# Altium footprint library main.PcbLib: 217 footprints (part 11 of 14)
Each footprint in its own frame and in the unit in brackets; x right, y up, seen from the top. Pads: shape width x height; smd on the part's side, far side on the other; paste and mask are expansions set on the pad; w line width, h text height; cw(c..) or ccw(c..) is an arc to the next point about the centre after c.
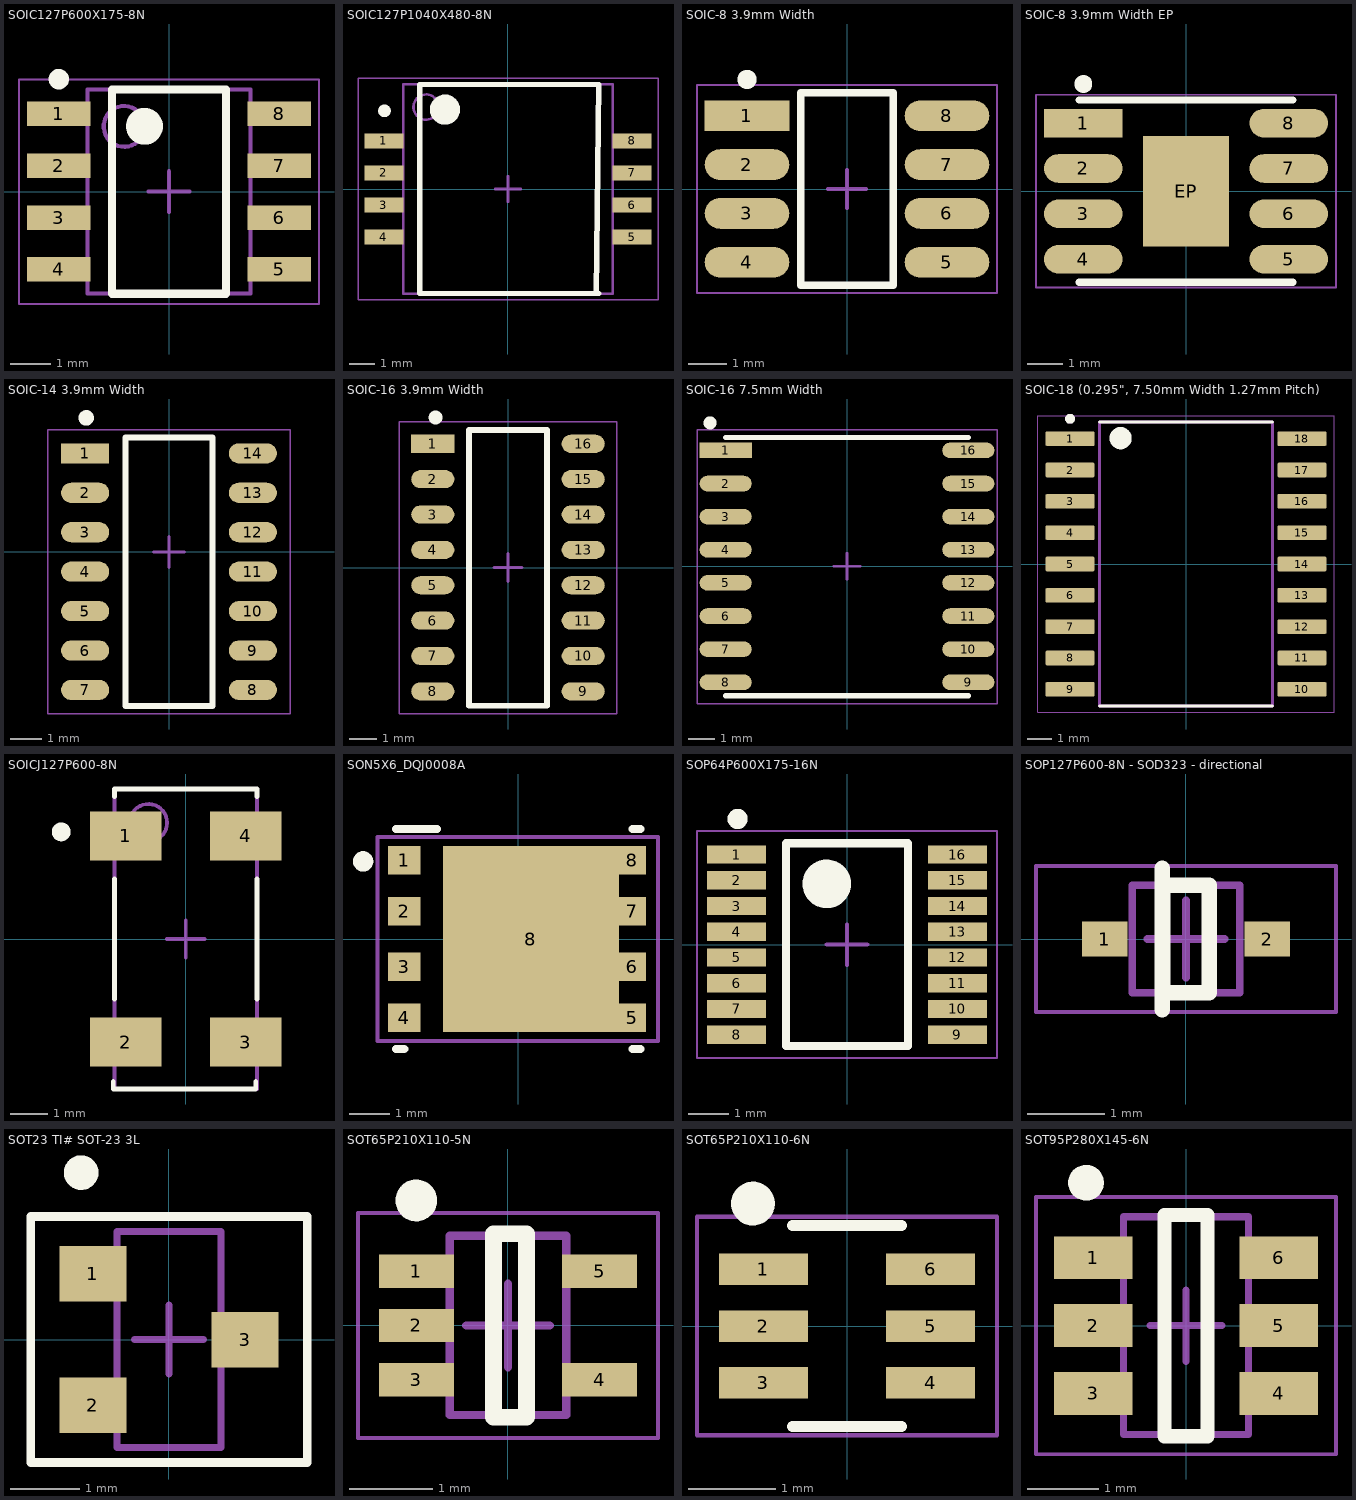
[diagram p10: the footprints below, top view; thin cyan lines are the x and y axes]

## SOIC127P600X175-8N [mm] "SOIC, 8-Leads, Body 4.90x3.90mm, Pitch 1.27mm, IPC Medium Density"
height 1.75
pads (8):
  rect 1.55x0.6 smd: 1(-2.7,1.905) 2(-2.7,0.635) 3(-2.7,-0.635) 4(-2.7,-1.905) 5(2.7,-1.905) 6(2.7,-0.635) 7(2.7,0.635) 8(2.7,1.905)
Top Overlay:
  circle w0.6: c-0.6,1.6 r0.15
  circle w0.25: c-2.7,2.755 r0.125
  lines w0.2: -1.4,-2.5 1.4,-2.5 1.4,2.5 -1.4,2.5 -1.4,-2.5
Mechanical 7:
  text ".Designator" at -2.921,-0.762 h1.52
Mechanical 13:
  circle w0.1: c-1.1,1.6 r0.5
  lines w0.1: -2,-2.5 2,-2.5 2,2.5 -2,2.5 -2,-2.5
Mechanical 15:
  lines w0.05: -3.675,-2.75 3.675,-2.75 3.675,2.75 -3.675,2.75 -3.675,-2.75
  lines w0.1: -0.5,0 0.5,0 ; 0,-0.5 0,0.5
3D body: height 1.75, standoff 0.2, extent -2,-2.5 2,2.5

## SOIC127P1040X480-8N [mm] "SOIC, 8-Leads, Body 8.26x8.26mm, Pitch 1.27mm, IPC Medium Density"
height 4.8
pads (8):
  rect 1.55x0.6 smd: 1(-4.925,1.905) 2(-4.925,0.635) 3(-4.925,-0.635) 4(-4.925,-1.905) 5(4.925,-1.905) 6(4.925,-0.635) 7(4.925,0.635) 8(4.925,1.905)
Top Overlay:
  circle w0.25: c-4.9,3.1 r0.125
  circle w0.6: c-2.5,3.15 r0.3
  lines w0.2: 3.5,-4.15 3.6,4.15 -3.5,4.15 -3.5,-4.15 3.6,-4.15
Mechanical 7:
  text ".Designator" at -3.615,-0.902 h1.52
Mechanical 13:
  circle w0.1: c-3.25,3.25 r0.5
  lines w0.1: -4.15,-4.15 -4.15,4.15 4.15,4.15 4.15,-4.15 -4.15,-4.15
Mechanical 15:
  lines w0.05: -5.95,-4.4 -5.95,4.4 5.95,4.4 5.95,-4.4 -5.95,-4.4
  lines w0.1: -0.5,0 0.5,0 ; 0,-0.5 0,0.5
3D body: height 9.88, standoff 4.8, extent -1.65,-1.647 1.65,1.647
3D body: height 4.8, standoff 0.36, extent -4.15,-4.15 4.15,4.15

## SOIC-8 3.9mm Width [mm] "SOIC-8 3.9mm Width"
height 2.65
pads (8):
  rect 2.2x0.8 smd mask+0.05: 1(-2.6,1.905)
  oval 2.2x0.8 smd mask+0.05: 2(-2.6,0.635) 3(-2.6,-0.635) 4(-2.6,-1.905) 5(2.6,-1.905) 6(2.6,-0.635) 7(2.6,0.635) 8(2.6,1.905)
Top Overlay:
  circle w0.25: c-2.6,2.85 r0.125
  lines w0.2: -1.2,-2.5 -1.2,2.5 1.2,2.5 1.2,-2.5 -1.2,-2.5
Mechanical 15:
  lines w0.05: -3.9,-2.7 -3.9,2.7 3.9,2.7 3.9,-2.7 -3.9,-2.7
  lines w0.1: -0.5,0 0.5,0 ; 0,-0.5 0,0.5
3D body "User Library-SOIC-8-1.STEP": height 1.75, standoff 0, extent -3,-2.45 3,2.45

## SOIC-8 3.9mm Width EP [mm] "SOIC-8 3.9mm Width EP"
height 2.65
pads (9):
  rect 2.2x0.8 smd mask+0.05: 1(-2.875,1.905)
  oval 2.2x0.8 smd mask+0.05: 2(-2.875,0.635) 3(-2.875,-0.635) 4(-2.875,-1.905) 5(2.875,-1.905) 6(2.875,-0.635) 7(2.875,0.635) 8(2.875,1.905)
  rect 2.4x3.1 all layers, no hole: EP(0,0)
Top Overlay:
  circle w0.25: c-2.875,3 r0.125
  lines w0.2: -3,-2.55 3,-2.55 ; -3,2.55 3,2.55
Mechanical 15:
  lines w0.05: -4.2,-2.7 -4.2,2.7 4.2,2.7 4.2,-2.7 -4.2,-2.7
3D body "User Library-SOIC-8-1.STEP": height 1.75, standoff 0, extent -3,-2.45 3,2.45

## SOIC-14 3.9mm Width [mm] "SOIC-14 3.9mm Width"
height 2.65
pads (14):
  rect 1.55x0.65 smd mask+0.05: 1(-2.7,3.175)
  oval 1.55x0.65 smd mask+0.05: 2(-2.7,1.905) 3(-2.7,0.635) 4(-2.7,-0.635) 5(-2.7,-1.905) 6(-2.7,-3.175) 7(-2.7,-4.445) 8(2.7,-4.445) 9(2.7,-3.175) 10(2.7,-1.905) 11(2.7,-0.635) 12(2.7,0.635) 13(2.7,1.905) 14(2.7,3.175)
Top Overlay:
  circle w0.25: c-2.667,4.318 r0.125
  lines w0.2: -1.4,-4.96 -1.4,3.683 1.4,3.683 1.4,-4.96 -1.4,-4.96
Mechanical 15:
  lines w0.05: -3.9,-5.207 -3.9,3.937 3.9,3.937 3.9,-5.207 -3.9,-5.207
  lines w0.1: -0.5,0 0.5,0 ; 0,-0.5 0,0.5
3D body "User Library-SOIC14-150-1.STEP": height 1.75, standoff 0, extent -2.9,-4.9 2.9,3.63

## SOIC-16 3.9mm Width [mm] "SOIC-16 3.9mm Width"
height 2.65
pads (16):
  rect 1.55x0.65 smd mask+0.05: 1(-2.7,4.445)
  oval 1.55x0.65 smd mask+0.05: 2(-2.7,3.175) 3(-2.7,1.905) 4(-2.7,0.635) 5(-2.7,-0.635) 6(-2.7,-1.905) 7(-2.7,-3.175) 8(-2.7,-4.445) 9(2.7,-4.445) 10(2.7,-3.175) 11(2.7,-1.905) 12(2.7,-0.635) 13(2.7,0.635) 14(2.7,1.905) 15(2.7,3.175) 16(2.7,4.445)
Top Overlay:
  circle w0.25: c-2.6,5.39 r0.125
  lines w0.2: -1.4,-4.96 1.4,-4.96 1.4,4.94 -1.4,4.94 -1.4,-4.96
Mechanical 15:
  lines w0.05: -3.9,-5.26 3.9,-5.26 3.9,5.24 -3.9,5.24 -3.9,-5.26
  lines w0.1: -0.5,0 0.5,0 ; 0,-0.5 0,0.5
3D body "User Library-SOIC-16-1.STEP": height 1.4, standoff 0, extent -3,-4.95 3,4.95

## SOIC-16 7.5mm Width [mm] "SOIC-16 3.9mm Width"
height 2.65
pads (16):
  rect 2x0.6 smd mask+0.05: 1(-4.65,4.445)
  oval 2x0.6 smd mask+0.05: 2(-4.65,3.175) 3(-4.65,1.905) 4(-4.65,0.635) 5(-4.65,-0.635) 6(-4.65,-1.905) 7(-4.65,-3.175) 8(-4.65,-4.445) 9(4.65,-4.445) 10(4.65,-3.175) 11(4.65,-1.905) 12(4.65,-0.635) 13(4.65,0.635) 14(4.65,1.905) 15(4.65,3.175) 16(4.65,4.445)
Top Overlay:
  circle w0.25: c-5.25,5.5 r0.125
  lines w0.2: -4.65,-4.96 4.65,-4.96 ; -4.65,4.94 4.65,4.94
Mechanical 15:
  lines w0.05: -5.75,-5.26 5.75,-5.26 5.75,5.24 -5.75,5.24 -5.75,-5.26
  lines w0.1: -0.5,0 0.5,0 ; 0,-0.5 0,0.5
3D body "DW0016A.stp": height 2.59, standoff 0, extent -5.167,-5.15 5.167,5.15

## SOIC-18 (0.295", 7.50mm Width 1.27mm Pitch) [mm] "SOIC-18 (0.295\", 7.50mm Width 1.27mm Pitch)"
height 1.1
pads (18):
  rrect25% 2x0.6 smd: 1(-4.7,5.08) 2(-4.7,3.81) 3(-4.7,2.54) 4(-4.7,1.27) 5(-4.7,0) 6(-4.7,-1.27) 7(-4.7,-2.54) 8(-4.7,-3.81) 9(-4.7,-5.08) 10(4.7,-5.08) 11(4.7,-3.81) 12(4.7,-2.54) 13(4.7,-1.27) 14(4.7,0) 15(4.7,1.27) 16(4.7,2.54) 17(4.7,3.81) 18(4.7,5.08)
Top Overlay:
  circle w0.6: c-2.65,5.1 r0.15
  circle w0.2: c-4.7,5.885 r0.1
  lines w0.127: -3.5,-5.75 3.5,-5.75 ; -3.5,5.75 3.5,5.75
Mechanical 7:
  text ".Designator" at -1.85,-0.35 h1.52
Mechanical 13:
  circle w0.2: c-4.7,5.885 r0.1
  lines w0.127: -3.5,-5.75 -3.5,5.75 3.5,5.75 3.5,-5.75 -3.5,-5.75
Mechanical 15:
  lines w0.05: -6,-6 -6,6 6,6 6,-6 -6,-6
3D body "User Library-SO-18W.STEP": height 2.48, standoff 0, extent -5.155,-5.79 5.155,5.79

## SOICJ127P600-8N [mm] "Crystal - ABS25 32.768kHz"
height 2.5
pads (4):
  rect 1.9x1.3 smd: 1(-1.6,2.75) 2(-1.6,-2.75) 3(1.6,-2.75) 4(1.6,2.75)
Top Overlay:
  circle w0.25: c-3.324,2.856 r0.125
  lines w0.127: -1.934,-3.8 -1.934,-4 1.866,-4 1.866,-3.8 ; -1.9,-1.6 -1.9,1.6 ; -1.9,3.8 -1.9,4 1.9,4 1.9,3.8 ; 1.9,-1.6 1.9,1.6
Mechanical 7:
  text ".Designator" at -1.969,-0.719 h1.52
Mechanical 13:
  circle w0.1: c-1,3.1 r0.5
  lines w0.1: -1.9,-4 -1.9,4 1.9,4 1.9,-4 -1.9,-4
Mechanical 15:
  lines w0.05: -1.9,-4 -1.9,4 1.9,4 1.9,-4 -1.9,-4
  lines w0.1: -0.5,0 0.5,0 ; -0.483,0 0.482,0 ; 0,-0.5 0,0.5 ; 0,-0.381 0,0.381
3D body: height 2.5, standoff 0.1, extent -1.9,-4 1.9,4

## SON5X6_DQJ0008A [mm] "TI SON5X6 package MOSFET"
height 0.025
pads (9):
  rect 0.8x0.7 smd paste-0.09: 1(-2.795,1.93) 2(-2.795,0.685) 3(-2.795,-0.685) 4(-2.795,-1.93)
  rect 0.68x0.7 smd paste-0.09: 5(2.795,-1.93) 6(2.795,-0.685) 7(2.795,0.685) 8(2.795,1.93)
  rect 4.32x4.56 smd paste+0: 8(0.308,0)
Top Overlay:
  circle w0.25: c-3.81,1.905 r0.125
  lines w0.2: -3,-2.7 -2.8,-2.7 ; -3,2.7 -2,2.7 ; 2.8,-2.7 3,-2.7 ; 2.8,2.7 3,2.7
Top Paste:
  rectangle: 0.693,-1.955 1.927,-0.385
  rectangle: 0.693,0.385 1.927,1.955
  rectangle: -1.392,-1.955 0.193,-0.385
  rectangle: -1.392,0.385 0.193,1.955
Top Solder:
  region: -1.189,-2.193 -1.19,-2.183 -1.19,2.183 -1.189,2.193 -1.186,2.203 -1.181,2.212 -1.175,2.22 -1.167,2.226 -1.158,2.231 -1.148,2.234 -1.138,2.235 2.238,2.235 2.248,2.234 2.258,2.231 2.267,2.226 2.275,2.22 2.281,2.212 2.286,2.203 2.289,2.193 2.29,2.183 2.29,-2.183 2.289,-2.193 2.286,-2.203 2.281,-2.212 2.275,-2.22 2.267,-2.226 2.258,-2.231 2.248,-2.234 2.238,-2.235 -1.138,-2.235 -1.148,-2.234 -1.158,-2.231 -1.167,-2.226 -1.175,-2.22 -1.181,-2.212 -1.186,-2.203
  region: 2.25,0.84 2.25,0.43 2.475,0.43 2.475,0.84
  region: 2.25,2.11 2.25,1.7 2.475,1.7 2.475,2.11
  region: 2.25,-1.7 2.25,-2.11 2.475,-2.11 2.475,-1.7
  region: 2.25,-0.43 2.25,-0.84 2.475,-0.84 2.475,-0.43
Mechanical 7:
  text ".Designator" at -2.413,-1.778 h1.52
Mechanical 15:
  lines w0.1: -3.457,-2.5 3.429,-2.5 3.429,2.5 -3.457,2.5 -3.457,-2.5
3D body "DQJ0008A.stp": height 1.15, standoff 0, extent -3.175,-2.436 3.085,2.464

## SOP64P600X175-16N [mm] "FT230XS-R SOP, 16-Leads, Body 4.90x3.90mm, Pitch 0.64mm, IPC Medium Density"
height 1.76
pads (16):
  rect 1.45x0.45 smd: 1(-2.725,2.222) 2(-2.725,1.587) 3(-2.725,0.953) 4(-2.725,0.318) 5(-2.725,-0.318) 6(-2.725,-0.953) 7(-2.725,-1.587) 8(-2.725,-2.222) 9(2.725,-2.222) 10(2.725,-1.587) 11(2.725,-0.953) 12(2.725,-0.318) 13(2.725,0.318) 14(2.725,0.953) 15(2.725,1.587) 16(2.725,2.222)
Top Overlay:
  circle w0.6: c-0.5,1.5 r0.3
  circle w0.25: c-2.7,3.1 r0.125
  lines w0.2: -1.5,-2.5 1.5,-2.5 1.5,2.5 -1.5,2.5 -1.5,-2.5
Mechanical 7:
  text ".Designator" at -1.295,-0.74 h0.76
Mechanical 15:
  lines w0.05: -3.7,-2.8 3.7,-2.8 3.7,2.8 -3.7,2.8 -3.7,-2.8
  lines w0.1: -0.5,0 0.5,0 ; 0,-0.5 0,0.5
3D body "User Library-SSOP16.STEP": height 1.05, standoff -0.05, extent -2.997,-2.439 2.997,2.539

## SOP127P600-8N - SOD323 - directional [mm] "SOD323 - directional"
height 1.1
pads (2):
  rect 0.59x0.45 smd: 1(-1.055,0) 2(1.055,0)
Top Overlay:
  lines w0.2: -0.31,-0.92 -0.31,0.92 ; -0.3,-0.7 -0.3,0.7 0.3,0.7 0.3,-0.7 -0.3,-0.7
Mechanical 7:
  text ".Designator" at -1.143,-0.254 h0.76
Mechanical 13:
  lines w0.1: -0.7,-0.7 -0.7,0.7 0.7,0.7 0.7,-0.7 -0.7,-0.7
Mechanical 15:
  lines w0.05: -1.95,-0.95 -1.95,0.95 1.95,0.95 1.95,-0.95 -1.95,-0.95
  lines w0.1: -0.5,0 0.5,0 ; 0,-0.5 0,0.5
3D body: height 1.1, standoff 0.1, extent -0.7,-0.7 0.7,0.7

## SOT23 TI# SOT-23 3L [mm] "SOT23, 3-Leads, Body 2.92x2.40mm, Pitch 0.95mm, IPC Medium Density"
height 1.2
pads (3):
  rect 0.972x0.802 smd: 1(-1.1,0.95) 2(-1.1,-0.95) 3(1.1,0)
Top Overlay:
  circle w0.25: c-1.27,2.413 r0.125
  lines w0.127: -2,-1.778 2,-1.778 2,1.778 -2,1.778 -2,-1.778
Mechanical 7:
  text ".Designator" at -1.778,-0.762 h1.52
Mechanical 13:
  lines w0.1: -0.75,-1.56 -0.75,1.56 0.75,1.56 0.75,-1.56 -0.75,-1.56
Mechanical 15:
  lines w0.05: -2,-1.8 -2,1.8 2,1.8 2,-1.8 -2,-1.8
  lines w0.1: -0.5,0 0.5,0 ; 0,-0.5 0,0.5
3D body: height 1.2, standoff 0.1, extent -0.75,-1.56 0.75,1.56

## SOT65P210X110-5N [mm] "SOT23, 5-Leads, Body 2.00x2.10mm, Pitch 0.65mm, IPC Medium Density"
height 1.1
pads (5):
  rect 0.9x0.4 smd: 1(-1.1,0.65) 2(-1.1,0) 3(-1.1,-0.65) 4(1.1,-0.65) 5(1.1,0.65)
Top Overlay:
  circle w0.25: c-1.1,1.5 r0.125
  lines w0.2: -0.175,-1.1 0.222,-1.1 0.222,1.1 -0.175,1.1 -0.175,-1.1
Mechanical 7:
  text ".Designator" at -1.247,-0.236 h0.76
Mechanical 13:
  lines w0.1: -0.7,-1.075 -0.7,1.075 0.7,1.075 0.7,-1.075 -0.7,-1.075
Mechanical 15:
  lines w0.05: -1.8,-1.35 -1.8,1.35 1.8,1.35 1.8,-1.35 -1.8,-1.35
  lines w0.1: -0.5,0 0.5,0 ; 0,-0.5 0,0.5
3D body: height 1.1, standoff 0.1, extent -0.7,-1.075 0.7,1.075

## SOT65P210X110-6N [mm]
pads (6):
  rect 1.02x0.36 smd: 1(-0.955,0.65) 2(-0.955,0) 3(-0.955,-0.65) 4(0.955,-0.65) 5(0.955,0) 6(0.955,0.65)
Top Overlay:
  circle w0.25: c-1.075,1.4 r0.125
  lines w0.127: -0.625,-1.15 0.625,-1.15 ; -0.625,1.15 0.625,1.15
Mechanical 7:
  text ".Designator" at -1.016,-0.381 h0.76
Mechanical 15:
  lines w0.05: -1.715,-1.25 -1.715,1.25 1.715,1.25 1.715,-1.25 -1.715,-1.25
3D body "User Library-SOT363-2.STEP": height 1.1, standoff 0, extent -1.2,-1.1 1.2,1.1

## SOT95P280X145-6N [mm] "SOT23, 6-Leads, Body 2.90x2.80mm, Pitch 0.95mm, IPC Medium Density"
height 1.45
pads (6):
  rect 1.1x0.6 smd: 1(-1.3,0.95) 2(-1.3,0) 3(-1.3,-0.95) 4(1.3,-0.95) 5(1.3,0) 6(1.3,0.95)
Top Overlay:
  circle w0.25: c-1.4,2 r0.125
  lines w0.2: -0.3,-1.55 0.3,-1.55 0.3,1.55 -0.3,1.55 -0.3,-1.55
Mechanical 7:
  text ".Designator" at -1.448,-0.136 h0.76
Mechanical 13:
  lines w0.1: -0.875,-1.525 -0.875,1.525 0.875,1.525 0.875,-1.525 -0.875,-1.525
Mechanical 15:
  lines w0.05: -2.1,-1.8 -2.1,1.8 2.1,1.8 2.1,-1.8 -2.1,-1.8
  lines w0.1: -0.5,0 0.5,0 ; 0,-0.5 0,0.5
3D body: height 1.45, standoff 0.25, extent -0.875,-1.525 0.875,1.525